# Altium integrated library WE_WR-TBL_Spring Clamp System_5.00 mm_rev15b.IntLib: 98 symbols (continued)
## 691401710024B (continued)
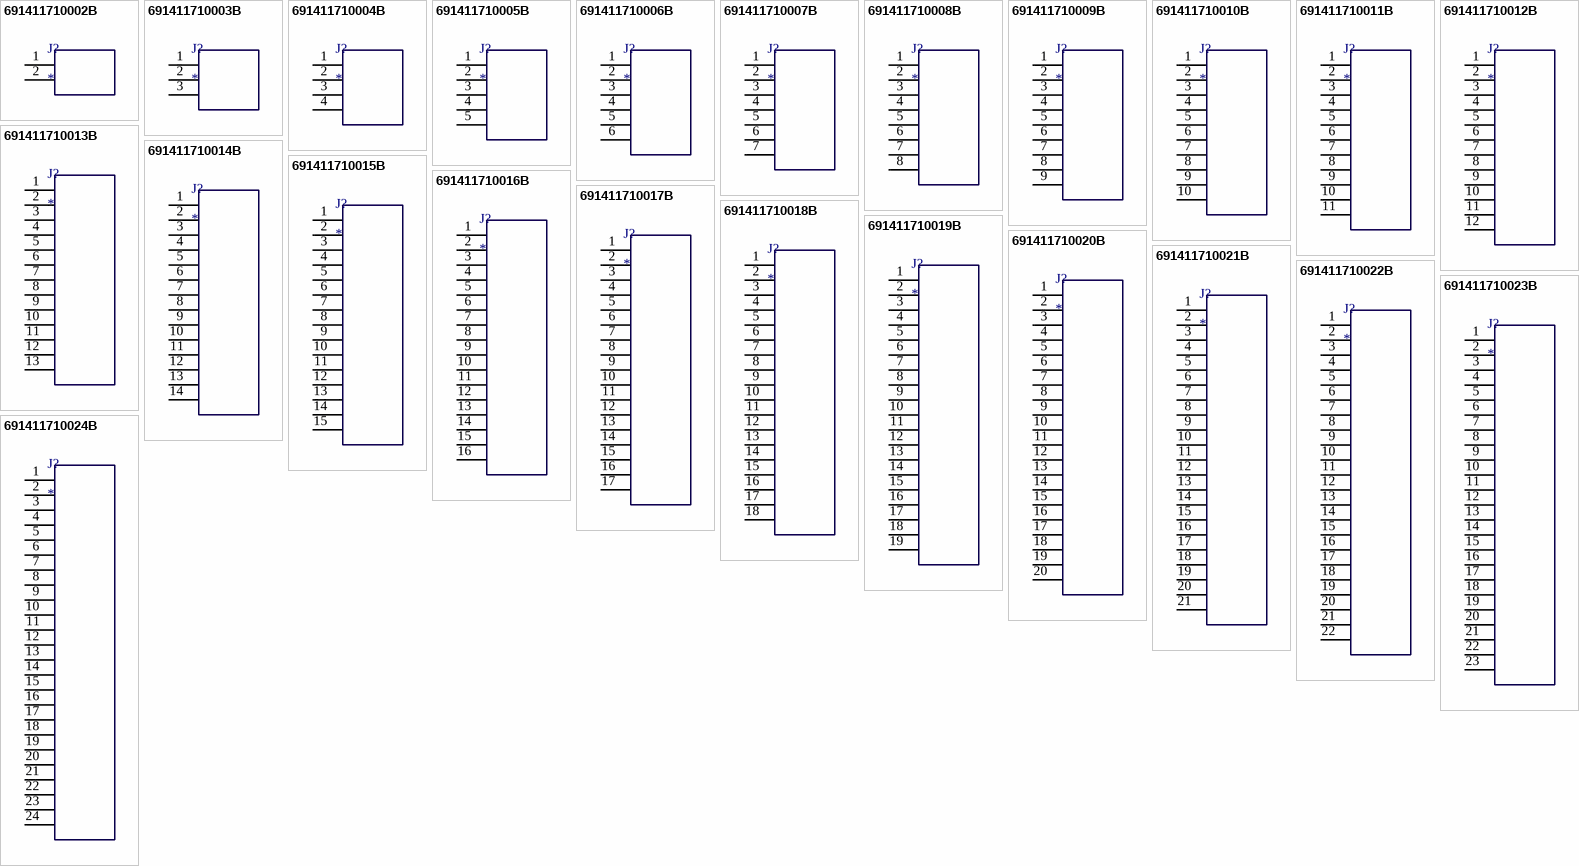
[diagram p2: symbols 691411710002B to 691411710024B]

## 691411710002B
designator J?
WR-TBL Screwless Entry Horizontal, Serie 411 B - 5.00 mm; Manufacturer: Würth Elektronik eiSos GmbH; partNo: 691411710002B; ComponentLink1 Description: Manufacturer; ComponentLink2 Description: Datasheet; NoPins: 4; ComponentLink1URL: http://www.we-online.de; ComponentLink2URL: http://katalog.we-online.de/em/datasheet/6914117100xx.pdf; Created by: Karrer Zheng; Created Date: 10/10/2014
footprint 691411710002B
pins: 1  , 2  

## 691411710003B
designator J?
WR-TBL Screwless Entry Horizontal, Serie 411 B - 5.00 mm; Manufacturer: Würth Elektronik eiSos GmbH; partNo: 691411710003B; ComponentLink1 Description: Manufacturer; ComponentLink2 Description: Datasheet; NoPins: 6; ComponentLink1URL: http://www.we-online.de; ComponentLink2URL: http://katalog.we-online.de/em/datasheet/6914117100xx.pdf; Created by: Karrer Zheng; Created Date: 10/10/2014
footprint 691411710003B
pins: 1  , 2  , 3  

## 691411710004B
designator J?
WR-TBL Screwless Entry Horizontal, Serie 411 B - 5.00 mm; Manufacturer: Würth Elektronik eiSos GmbH; partNo: 691411710004B; ComponentLink1 Description: Manufacturer; ComponentLink2 Description: Datasheet; NoPins: 8; ComponentLink1URL: http://www.we-online.de; ComponentLink2URL: http://katalog.we-online.de/em/datasheet/6914117100xx.pdf; Created by: Karrer Zheng; Created Date: 10/10/2014
footprint 691411710004B
pins: 1  , 2  , 3  , 4  

## 691411710005B
designator J?
WR-TBL Screwless Entry Horizontal, Serie 411 B - 5.00 mm; Manufacturer: Würth Elektronik eiSos GmbH; partNo: 691411710005B; ComponentLink1 Description: Manufacturer; ComponentLink2 Description: Datasheet; NoPins: 10; ComponentLink1URL: http://www.we-online.de; ComponentLink2URL: http://katalog.we-online.de/em/datasheet/6914117100xx.pdf; Created by: Karrer Zheng; Created Date: 10/10/2014
footprint 691411710005B
pins: 1  , 2  , 3  , 4  , 5  

## 691411710006B
designator J?
WR-TBL Screwless Entry Horizontal, Serie 411 B - 5.00 mm; Manufacturer: Würth Elektronik eiSos GmbH; partNo: 691411710006B; ComponentLink1 Description: Manufacturer; ComponentLink2 Description: Datasheet; NoPins: 12; ComponentLink1URL: http://www.we-online.de; ComponentLink2URL: http://katalog.we-online.de/em/datasheet/6914117100xx.pdf; Created by: Karrer Zheng; Created Date: 10/10/2014
footprint 691411710006B
pins: 1  , 2  , 3  , 4  , 5  , 6  

## 691411710007B
designator J?
WR-TBL Screwless Entry Horizontal, Serie 411 B - 5.00 mm; Manufacturer: Würth Elektronik eiSos GmbH; partNo: 691411710007B; ComponentLink1 Description: Manufacturer; ComponentLink2 Description: Datasheet; NoPins: 14; ComponentLink1URL: http://www.we-online.de; ComponentLink2URL: http://katalog.we-online.de/em/datasheet/6914117100xx.pdf; Created by: Karrer Zheng; Created Date: 10/10/2014
footprint 691411710007B
pins: 1  , 2  , 3  , 4  , 5  , 6  , 7  

## 691411710008B
designator J?
WR-TBL Screwless Entry Horizontal, Serie 411 B - 5.00 mm; Manufacturer: Würth Elektronik eiSos GmbH; partNo: 691411710008B; ComponentLink1 Description: Manufacturer; ComponentLink2 Description: Datasheet; NoPins: 16; ComponentLink1URL: http://www.we-online.de; ComponentLink2URL: http://katalog.we-online.de/em/datasheet/6914117100xx.pdf; Created by: Karrer Zheng; Created Date: 10/10/2014
footprint 691411710008B
pins: 1  , 2  , 3  , 4  , 5  , 6  , 7  , 8  

## 691411710009B
designator J?
WR-TBL Screwless Entry Horizontal, Serie 411 B - 5.00 mm; Manufacturer: Würth Elektronik eiSos GmbH; partNo: 691411710009B; ComponentLink1 Description: Manufacturer; ComponentLink2 Description: Datasheet; NoPins: 18; ComponentLink1URL: http://www.we-online.de; ComponentLink2URL: http://katalog.we-online.de/em/datasheet/6914117100xx.pdf; Created by: Karrer Zheng; Created Date: 10/10/2014
footprint 691411710009B
pins: 1  , 2  , 3  , 4  , 5  , 6  , 7  , 8  , 9  

## 691411710010B
designator J?
WR-TBL Screwless Entry Horizontal, Serie 411 B - 5.00 mm; Manufacturer: Würth Elektronik eiSos GmbH; partNo: 691411710010B; ComponentLink1 Description: Manufacturer; ComponentLink2 Description: Datasheet; NoPins: 20; ComponentLink1URL: http://www.we-online.de; ComponentLink2URL: http://katalog.we-online.de/em/datasheet/6914117100xx.pdf; Created by: Karrer Zheng; Created Date: 10/10/2014
footprint 691411710010B
pins: 1  , 2  , 3  , 4  , 5  , 6  , 7  , 8  , 9  , 10  

## 691411710011B
designator J?
WR-TBL Screwless Entry Horizontal, Serie 411 B - 5.00 mm; Manufacturer: Würth Elektronik eiSos GmbH; partNo: 691411710011B; ComponentLink1 Description: Manufacturer; ComponentLink2 Description: Datasheet; NoPins: 22; ComponentLink1URL: http://www.we-online.de; ComponentLink2URL: http://katalog.we-online.de/em/datasheet/6914117100xx.pdf; Created by: Karrer Zheng; Created Date: 10/10/2014
footprint 691411710011B
pins: 1  , 2  , 3  , 4  , 5  , 6  , 7  , 8  , 9  , 10  , 11  

## 691411710012B
designator J?
WR-TBL Screwless Entry Horizontal, Serie 411 B - 5.00 mm; Manufacturer: Würth Elektronik eiSos GmbH; partNo: 691411710012B; ComponentLink1 Description: Manufacturer; ComponentLink2 Description: Datasheet; NoPins: 24; ComponentLink1URL: http://www.we-online.de; ComponentLink2URL: http://katalog.we-online.de/em/datasheet/6914117100xx.pdf; Created by: Karrer Zheng; Created Date: 10/10/2014
footprint 691411710012B
pins: 1  , 2  , 3  , 4  , 5  , 6  , 7  , 8  , 9  , 10  , 11  , 12  

## 691411710013B
designator J?
WR-TBL Screwless Entry Horizontal, Serie 411 B - 5.00 mm; Manufacturer: Würth Elektronik eiSos GmbH; partNo: 691411710013B; ComponentLink1 Description: Manufacturer; ComponentLink2 Description: Datasheet; NoPins: 26; ComponentLink1URL: http://www.we-online.de; ComponentLink2URL: http://katalog.we-online.de/em/datasheet/6914117100xx.pdf; Created by: Karrer Zheng; Created Date: 10/10/2014
footprint 691411710013B
pins: 1  , 2  , 3  , 4  , 5  , 6  , 7  , 8  , 9  , 10  , 11  , 12  , 13  

## 691411710014B
designator J?
WR-TBL Screwless Entry Horizontal, Serie 411 B - 5.00 mm; Manufacturer: Würth Elektronik eiSos GmbH; partNo: 691411710014B; ComponentLink1 Description: Manufacturer; ComponentLink2 Description: Datasheet; NoPins: 28; ComponentLink1URL: http://www.we-online.de; ComponentLink2URL: http://katalog.we-online.de/em/datasheet/6914117100xx.pdf; Created by: Karrer Zheng; Created Date: 10/10/2014
footprint 691411710014B
pins: 1  , 2  , 3  , 4  , 5  , 6  , 7  , 8  , 9  , 10  , 11  , 12  , 13  , 14  

## 691411710015B
designator J?
WR-TBL Screwless Entry Horizontal, Serie 411 B - 5.00 mm; Manufacturer: Würth Elektronik eiSos GmbH; partNo: 691411710015B; ComponentLink1 Description: Manufacturer; ComponentLink2 Description: Datasheet; NoPins: 30; ComponentLink1URL: http://www.we-online.de; ComponentLink2URL: http://katalog.we-online.de/em/datasheet/6914117100xx.pdf; Created by: Karrer Zheng; Created Date: 10/10/2014
footprint 691411710015B
pins: 1  , 2  , 3  , 4  , 5  , 6  , 7  , 8  , 9  , 10  , 11  , 12  , 13  , 14  , 15  

## 691411710016B
designator J?
WR-TBL Screwless Entry Horizontal, Serie 411 B - 5.00 mm; Manufacturer: Würth Elektronik eiSos GmbH; partNo: 691411710016B; ComponentLink1 Description: Manufacturer; ComponentLink2 Description: Datasheet; NoPins: 32; ComponentLink1URL: http://www.we-online.de; ComponentLink2URL: http://katalog.we-online.de/em/datasheet/6914117100xx.pdf; Created by: Karrer Zheng; Created Date: 10/10/2014
footprint 691411710016B
pins: 1  , 2  , 3  , 4  , 5  , 6  , 7  , 8  , 9  , 10  , 11  , 12  , 13  , 14  , 15  , 16  

## 691411710017B
designator J?
WR-TBL Screwless Entry Horizontal, Serie 411 B - 5.00 mm; Manufacturer: Würth Elektronik eiSos GmbH; partNo: 691411710017B; ComponentLink1 Description: Manufacturer; ComponentLink2 Description: Datasheet; NoPins: 34; ComponentLink1URL: http://www.we-online.de; ComponentLink2URL: http://katalog.we-online.de/em/datasheet/6914117100xx.pdf; Created by: Karrer Zheng; Created Date: 10/10/2014
footprint 691411710017B
pins: 1  , 2  , 3  , 4  , 5  , 6  , 7  , 8  , 9  , 10  , 11  , 12  , 13  , 14  , 15  , 16  , 17  

## 691411710018B
designator J?
WR-TBL Screwless Entry Horizontal, Serie 411 B - 5.00 mm; Manufacturer: Würth Elektronik eiSos GmbH; partNo: 691411710018B; ComponentLink1 Description: Manufacturer; ComponentLink2 Description: Datasheet; NoPins: 36; ComponentLink1URL: http://www.we-online.de; ComponentLink2URL: http://katalog.we-online.de/em/datasheet/6914117100xx.pdf; Created by: Karrer Zheng; Created Date: 10/10/2014
footprint 691411710018B
pins: 1  , 2  , 3  , 4  , 5  , 6  , 7  , 8  , 9  , 10  , 11  , 12  , 13  , 14  , 15  , 16  , 17  , 18  

## 691411710019B
designator J?
WR-TBL Screwless Entry Horizontal, Serie 411 B - 5.00 mm; Manufacturer: Würth Elektronik eiSos GmbH; partNo: 691411710019B; ComponentLink1 Description: Manufacturer; ComponentLink2 Description: Datasheet; NoPins: 38; ComponentLink1URL: http://www.we-online.de; ComponentLink2URL: http://katalog.we-online.de/em/datasheet/6914117100xx.pdf; Created by: Karrer Zheng; Created Date: 10/10/2014
footprint 691411710019B
pins: 1  , 2  , 3  , 4  , 5  , 6  , 7  , 8  , 9  , 10  , 11  , 12  , 13  , 14  , 15  , 16  , 17  , 18  , 19  

## 691411710020B
designator J?
WR-TBL Screwless Entry Horizontal, Serie 411 B - 5.00 mm; Manufacturer: Würth Elektronik eiSos GmbH; partNo: 691411710020B; ComponentLink1 Description: Manufacturer; ComponentLink2 Description: Datasheet; NoPins: 40; ComponentLink1URL: http://www.we-online.de; ComponentLink2URL: http://katalog.we-online.de/em/datasheet/6914117100xx.pdf; Created by: Karrer Zheng; Created Date: 10/10/2014
footprint 691411710020B
pins: 1  , 2  , 3  , 4  , 5  , 6  , 7  , 8  , 9  , 10  , 11  , 12  , 13  , 14  , 15  , 16  , 17  , 18  , 19  , 20  

## 691411710021B
designator J?
WR-TBL Screwless Entry Horizontal, Serie 411 B - 5.00 mm; Manufacturer: Würth Elektronik eiSos GmbH; partNo: 691411710021B; ComponentLink1 Description: Manufacturer; ComponentLink2 Description: Datasheet; NoPins: 42; ComponentLink1URL: http://www.we-online.de; ComponentLink2URL: http://katalog.we-online.de/em/datasheet/6914117100xx.pdf; Created by: Karrer Zheng; Created Date: 10/10/2014
footprint 691411710021B
pins: 1  , 2  , 3  , 4  , 5  , 6  , 7  , 8  , 9  , 10  , 11  , 12  , 13  , 14  , 15  , 16  , 17  , 18  , 19  , 20  , 21  

## 691411710022B
designator J?
WR-TBL Screwless Entry Horizontal, Serie 411 B - 5.00 mm; Manufacturer: Würth Elektronik eiSos GmbH; partNo: 691411710022B; ComponentLink1 Description: Manufacturer; ComponentLink2 Description: Datasheet; NoPins: 44; ComponentLink1URL: http://www.we-online.de; ComponentLink2URL: http://katalog.we-online.de/em/datasheet/6914117100xx.pdf; Created by: Karrer Zheng; Created Date: 10/10/2014
footprint 691411710022B
pins: 1  , 2  , 3  , 4  , 5  , 6  , 7  , 8  , 9  , 10  , 11  , 12  , 13  , 14  , 15  , 16  , 17  , 18  , 19  , 20  , 21  , 22  

## 691411710023B
designator J?
WR-TBL Screwless Entry Horizontal, Serie 411 B - 5.00 mm; Manufacturer: Würth Elektronik eiSos GmbH; partNo: 691411710023B; ComponentLink1 Description: Manufacturer; ComponentLink2 Description: Datasheet; NoPins: 46; ComponentLink1URL: http://www.we-online.de; ComponentLink2URL: http://katalog.we-online.de/em/datasheet/6914117100xx.pdf; Created by: Karrer Zheng; Created Date: 10/10/2014
footprint 691411710023B
pins: 1  , 2  , 3  , 4  , 5  , 6  , 7  , 8  , 9  , 10  , 11  , 12  , 13  , 14  , 15  , 16  , 17  , 18  , 19  , 20  , 21  , 22  , 23  

## 691411710024B
designator J?
WR-TBL Screwless Entry Horizontal, Serie 411 B - 5.00 mm; Manufacturer: Würth Elektronik eiSos GmbH; partNo: 691411710024B; ComponentLink1 Description: Manufacturer; ComponentLink2 Description: Datasheet; NoPins: 48; ComponentLink1URL: http://www.we-online.de; ComponentLink2URL: http://katalog.we-online.de/em/datasheet/6914117100xx.pdf; Created by: Karrer Zheng; Created Date: 10/10/2014
footprint 691411710024B
pins: 1  , 2  , 3  , 4  , 5  , 6  , 7  , 8  , 9  , 10  , 11  , 12  , 13  , 14  , 15  , 16  , 17  , 18  , 19  , 20  , 21  , 22  , 23  , 24  


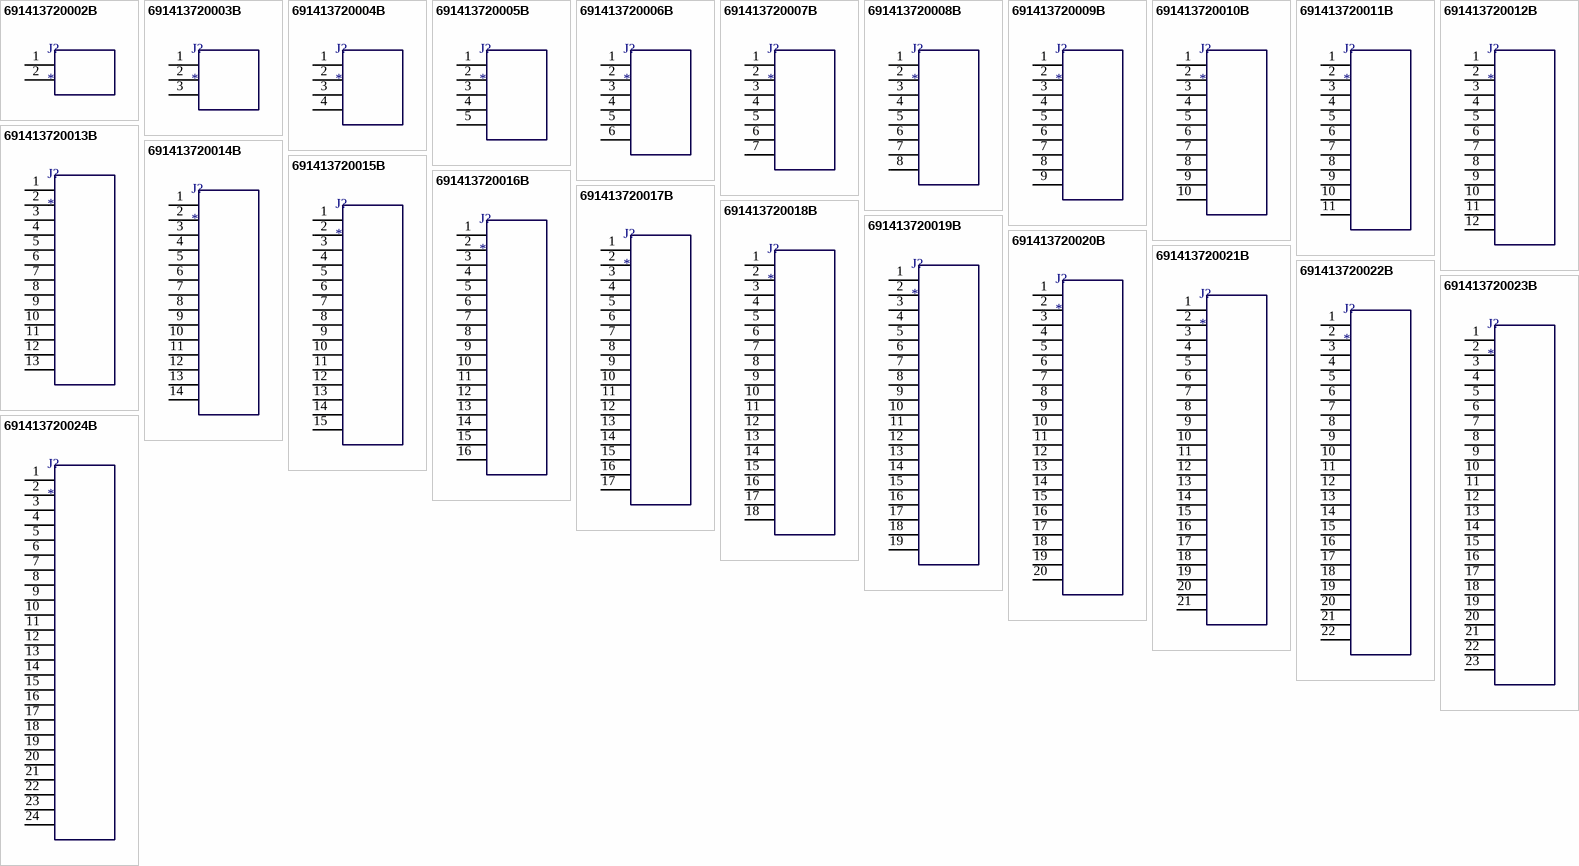
[diagram p3: symbols 691413720002B to 691413720024B]

## 691413720002B
designator J?
WR-TBL Screwless Entry 45°, Serie 413 B - 5.0 mm; Manufacturer: Würth Elektronik eiSos GmbH; partNo: 691413720002B; ComponentLink1 Description: Manufacturer; ComponentLink2 Description: Datasheet; NoPins: 4; ComponentLink1URL: http://www.we-online.de; ComponentLink2URL: http://katalog.we-online.de/em/datasheet/6914137200xxB.pdf; Created by: Karrer Zheng; Created Date: 10/1/2014
footprint 691413720002B
pins: 1  , 2  

## 691413720003B
designator J?
WR-TBL Screwless Entry 45°, Serie 413 B - 5.0 mm; Manufacturer: Würth Elektronik eiSos GmbH; partNo: 691413720003B; ComponentLink1 Description: Manufacturer; ComponentLink2 Description: Datasheet; NoPins: 6; ComponentLink1URL: http://www.we-online.de; ComponentLink2URL: http://katalog.we-online.de/em/datasheet/6914137200xxB.pdf; Created by: Karrer Zheng; Created Date: 10/1/2014
footprint 691413720003B
pins: 1  , 2  , 3  

## 691413720004B
designator J?
WR-TBL Screwless Entry 45°, Serie 413 B - 5.0 mm; Manufacturer: Würth Elektronik eiSos GmbH; partNo: 691413720004B; ComponentLink1 Description: Manufacturer; ComponentLink2 Description: Datasheet; NoPins: 8; ComponentLink1URL: http://www.we-online.de; ComponentLink2URL: http://katalog.we-online.de/em/datasheet/6914137200xxB.pdf; Created by: Karrer Zheng; Created Date: 10/1/2014
footprint 691413720004B
pins: 1  , 2  , 3  , 4  

## 691413720005B
designator J?
WR-TBL Screwless Entry 45°, Serie 413 B - 5.0 mm; Manufacturer: Würth Elektronik eiSos GmbH; partNo: 691413720005B; ComponentLink1 Description: Manufacturer; ComponentLink2 Description: Datasheet; NoPins: 10; ComponentLink1URL: http://www.we-online.de; ComponentLink2URL: http://katalog.we-online.de/em/datasheet/6914137200xxB.pdf; Created by: Karrer Zheng; Created Date: 10/1/2014
footprint 691413720005B
pins: 1  , 2  , 3  , 4  , 5  

## 691413720006B
designator J?
WR-TBL Screwless Entry 45°, Serie 413 B - 5.0 mm; Manufacturer: Würth Elektronik eiSos GmbH; partNo: 691413720006B; ComponentLink1 Description: Manufacturer; ComponentLink2 Description: Datasheet; NoPins: 12; ComponentLink1URL: http://www.we-online.de; ComponentLink2URL: http://katalog.we-online.de/em/datasheet/6914137200xxB.pdf; Created by: Karrer Zheng; Created Date: 10/1/2014
footprint 691413720006B
pins: 1  , 2  , 3  , 4  , 5  , 6  

## 691413720007B
designator J?
WR-TBL Screwless Entry 45°, Serie 413 B - 5.0 mm; Manufacturer: Würth Elektronik eiSos GmbH; partNo: 691413720007B; ComponentLink1 Description: Manufacturer; ComponentLink2 Description: Datasheet; NoPins: 14; ComponentLink1URL: http://www.we-online.de; ComponentLink2URL: http://katalog.we-online.de/em/datasheet/6914137200xxB.pdf; Created by: Karrer Zheng; Created Date: 10/1/2014
footprint 691413720007B
pins: 1  , 2  , 3  , 4  , 5  , 6  , 7  

## 691413720008B
designator J?
WR-TBL Screwless Entry 45°, Serie 413 B - 5.0 mm; Manufacturer: Würth Elektronik eiSos GmbH; partNo: 691413720008B; ComponentLink1 Description: Manufacturer; ComponentLink2 Description: Datasheet; NoPins: 16; ComponentLink1URL: http://www.we-online.de; ComponentLink2URL: http://katalog.we-online.de/em/datasheet/6914137200xxB.pdf; Created by: Karrer Zheng; Created Date: 10/1/2014
footprint 691413720008B
pins: 1  , 2  , 3  , 4  , 5  , 6  , 7  , 8  

## 691413720009B
designator J?
WR-TBL Screwless Entry 45°, Serie 413 B - 5.0 mm; Manufacturer: Würth Elektronik eiSos GmbH; partNo: 691413720009B; ComponentLink1 Description: Manufacturer; ComponentLink2 Description: Datasheet; NoPins: 18; ComponentLink1URL: http://www.we-online.de; ComponentLink2URL: http://katalog.we-online.de/em/datasheet/6914137200xxB.pdf; Created by: Karrer Zheng; Created Date: 10/1/2014
footprint 691413720009B
pins: 1  , 2  , 3  , 4  , 5  , 6  , 7  , 8  , 9  

## 691413720010B
designator J?
WR-TBL Screwless Entry 45°, Serie 413 B - 5.0 mm; Manufacturer: Würth Elektronik eiSos GmbH; partNo: 691413720010B; ComponentLink1 Description: Manufacturer; ComponentLink2 Description: Datasheet; NoPins: 20; ComponentLink1URL: http://www.we-online.de; ComponentLink2URL: http://katalog.we-online.de/em/datasheet/6914137200xxB.pdf; Created by: Karrer Zheng; Created Date: 10/1/2014
footprint 691413720010B (5.0mm - Spring clamp/Screw less - 45° entry - 11p)
pins: 1  , 2  , 3  , 4  , 5  , 6  , 7  , 8  , 9  , 10  

## 691413720011B
designator J?
WR-TBL Screwless Entry 45°, Serie 413 B - 5.0 mm; Manufacturer: Würth Elektronik eiSos GmbH; partNo: 691413720011B; ComponentLink1 Description: Manufacturer; ComponentLink2 Description: Datasheet; NoPins: 22; ComponentLink1URL: http://www.we-online.de; ComponentLink2URL: http://katalog.we-online.de/em/datasheet/6914137200xxB.pdf; Created by: Karrer Zheng; Created Date: 10/1/2014
footprint 691413720011B
pins: 1  , 2  , 3  , 4  , 5  , 6  , 7  , 8  , 9  , 10  , 11  

## 691413720012B
designator J?
WR-TBL Screwless Entry 45°, Serie 413 B - 5.0 mm; Manufacturer: Würth Elektronik eiSos GmbH; partNo: 691413720012B; ComponentLink1 Description: Manufacturer; ComponentLink2 Description: Datasheet; NoPins: 24; ComponentLink1URL: http://www.we-online.de; ComponentLink2URL: http://katalog.we-online.de/em/datasheet/6914137200xxB.pdf; Created by: Karrer Zheng; Created Date: 10/1/2014
footprint 691413720012B
pins: 1  , 2  , 3  , 4  , 5  , 6  , 7  , 8  , 9  , 10  , 11  , 12  

## 691413720013B
designator J?
WR-TBL Screwless Entry 45°, Serie 413 B - 5.0 mm; Manufacturer: Würth Elektronik eiSos GmbH; partNo: 691413720013B; ComponentLink1 Description: Manufacturer; ComponentLink2 Description: Datasheet; NoPins: 26; ComponentLink1URL: http://www.we-online.de; ComponentLink2URL: http://katalog.we-online.de/em/datasheet/6914137200xxB.pdf; Created by: Karrer Zheng; Created Date: 10/1/2014
footprint 691413720013B
pins: 1  , 2  , 3  , 4  , 5  , 6  , 7  , 8  , 9  , 10  , 11  , 12  , 13  

## 691413720014B
designator J?
WR-TBL Screwless Entry 45°, Serie 413 B - 5.0 mm; Manufacturer: Würth Elektronik eiSos GmbH; partNo: 691413720014B; ComponentLink1 Description: Manufacturer; ComponentLink2 Description: Datasheet; NoPins: 28; ComponentLink1URL: http://www.we-online.de; ComponentLink2URL: http://katalog.we-online.de/em/datasheet/6914137200xxB.pdf; Created by: Karrer Zheng; Created Date: 10/1/2014
footprint 691413720014B
pins: 1  , 2  , 3  , 4  , 5  , 6  , 7  , 8  , 9  , 10  , 11  , 12  , 13  , 14  

## 691413720015B
designator J?
WR-TBL Screwless Entry 45°, Serie 413 B - 5.0 mm; Manufacturer: Würth Elektronik eiSos GmbH; partNo: 691413720015B; ComponentLink1 Description: Manufacturer; ComponentLink2 Description: Datasheet; NoPins: 30; ComponentLink1URL: http://www.we-online.de; ComponentLink2URL: http://katalog.we-online.de/em/datasheet/6914137200xxB.pdf; Created by: Karrer Zheng; Created Date: 10/1/2014
footprint 691413720015B
pins: 1  , 2  , 3  , 4  , 5  , 6  , 7  , 8  , 9  , 10  , 11  , 12  , 13  , 14  , 15  

## 691413720016B
designator J?
WR-TBL Screwless Entry 45°, Serie 413 B - 5.0 mm; Manufacturer: Würth Elektronik eiSos GmbH; partNo: 691413720016B; ComponentLink1 Description: Manufacturer; ComponentLink2 Description: Datasheet; NoPins: 32; ComponentLink1URL: http://www.we-online.de; ComponentLink2URL: http://katalog.we-online.de/em/datasheet/6914137200xxB.pdf; Created by: Karrer Zheng; Created Date: 10/1/2014
footprint 691413720016B
pins: 1  , 2  , 3  , 4  , 5  , 6  , 7  , 8  , 9  , 10  , 11  , 12  , 13  , 14  , 15  , 16  

## 691413720017B
designator J?
WR-TBL Screwless Entry 45°, Serie 413 B - 5.0 mm; Manufacturer: Würth Elektronik eiSos GmbH; partNo: 691413720017B; ComponentLink1 Description: Manufacturer; ComponentLink2 Description: Datasheet; NoPins: 34; ComponentLink1URL: http://www.we-online.de; ComponentLink2URL: http://katalog.we-online.de/em/datasheet/6914137200xxB.pdf; Created by: Karrer Zheng; Created Date: 10/1/2014
footprint 691413720017B
pins: 1  , 2  , 3  , 4  , 5  , 6  , 7  , 8  , 9  , 10  , 11  , 12  , 13  , 14  , 15  , 16  , 17  

## 691413720018B
designator J?
WR-TBL Screwless Entry 45°, Serie 413 B - 5.0 mm; Manufacturer: Würth Elektronik eiSos GmbH; partNo: 691413720018B; ComponentLink1 Description: Manufacturer; ComponentLink2 Description: Datasheet; NoPins: 36; ComponentLink1URL: http://www.we-online.de; ComponentLink2URL: http://katalog.we-online.de/em/datasheet/6914137200xxB.pdf; Created by: Karrer Zheng; Created Date: 10/1/2014
footprint 691413720018B
pins: 1  , 2  , 3  , 4  , 5  , 6  , 7  , 8  , 9  , 10  , 11  , 12  , 13  , 14  , 15  , 16  , 17  , 18  

## 691413720019B
designator J?
WR-TBL Screwless Entry 45°, Serie 413 B - 5.0 mm; Manufacturer: Würth Elektronik eiSos GmbH; partNo: 691413720019B; ComponentLink1 Description: Manufacturer; ComponentLink2 Description: Datasheet; NoPins: 38; ComponentLink1URL: http://www.we-online.de; ComponentLink2URL: http://katalog.we-online.de/em/datasheet/6914137200xxB.pdf; Created by: Karrer Zheng; Created Date: 10/1/2014
footprint 691413720019B
pins: 1  , 2  , 3  , 4  , 5  , 6  , 7  , 8  , 9  , 10  , 11  , 12  , 13  , 14  , 15  , 16  , 17  , 18  , 19  

## 691413720020B
designator J?
WR-TBL Screwless Entry 45°, Serie 413 B - 5.0 mm; Manufacturer: Würth Elektronik eiSos GmbH; partNo: 691413720020B; ComponentLink1 Description: Manufacturer; ComponentLink2 Description: Datasheet; NoPins: 40; ComponentLink1URL: http://www.we-online.de; ComponentLink2URL: http://katalog.we-online.de/em/datasheet/6914137200xxB.pdf; Created by: Karrer Zheng; Created Date: 10/1/2014
footprint 691413720020B
pins: 1  , 2  , 3  , 4  , 5  , 6  , 7  , 8  , 9  , 10  , 11  , 12  , 13  , 14  , 15  , 16  , 17  , 18  , 19  , 20  

## 691413720021B
designator J?
WR-TBL Screwless Entry 45°, Serie 413 B - 5.0 mm; Manufacturer: Würth Elektronik eiSos GmbH; partNo: 691413720021B; ComponentLink1 Description: Manufacturer; ComponentLink2 Description: Datasheet; NoPins: 42; ComponentLink1URL: http://www.we-online.de; ComponentLink2URL: http://katalog.we-online.de/em/datasheet/6914137200xxB.pdf; Created by: Karrer Zheng; Created Date: 10/1/2014
footprint 691413720021B
pins: 1  , 2  , 3  , 4  , 5  , 6  , 7  , 8  , 9  , 10  , 11  , 12  , 13  , 14  , 15  , 16  , 17  , 18  , 19  , 20  , 21  

## 691413720022B
designator J?
WR-TBL Screwless Entry 45°, Serie 413 B - 5.0 mm; Manufacturer: Würth Elektronik eiSos GmbH; partNo: 691413720022B; ComponentLink1 Description: Manufacturer; ComponentLink2 Description: Datasheet; NoPins: 44; ComponentLink1URL: http://www.we-online.de; ComponentLink2URL: http://katalog.we-online.de/em/datasheet/6914137200xxB.pdf; Created by: Karrer Zheng; Created Date: 10/1/2014
footprint 691413720022B
pins: 1  , 2  , 3  , 4  , 5  , 6  , 7  , 8  , 9  , 10  , 11  , 12  , 13  , 14  , 15  , 16  , 17  , 18  , 19  , 20  , 21  , 22  

## 691413720023B
designator J?
WR-TBL Screwless Entry 45°, Serie 413 B - 5.0 mm; Manufacturer: Würth Elektronik eiSos GmbH; partNo: 691413720023B; ComponentLink1 Description: Manufacturer; ComponentLink2 Description: Datasheet; NoPins: 46; ComponentLink1URL: http://www.we-online.de; ComponentLink2URL: http://katalog.we-online.de/em/datasheet/6914137200xxB.pdf; Created by: Karrer Zheng; Created Date: 10/1/2014
footprint 691413720023B
pins: 1  , 2  , 3  , 4  , 5  , 6  , 7  , 8  , 9  , 10  , 11  , 12  , 13  , 14  , 15  , 16  , 17  , 18  , 19  , 20  , 21  , 22  , 23  

## 691413720024B
designator J?
WR-TBL Screwless Entry 45°, Serie 413 B - 5.0 mm; Manufacturer: Würth Elektronik eiSos GmbH; partNo: 691413720024B; ComponentLink1 Description: Manufacturer; ComponentLink2 Description: Datasheet; NoPins: 48; ComponentLink1URL: http://www.we-online.de; ComponentLink2URL: http://katalog.we-online.de/em/datasheet/6914137200xxB.pdf; Created by: Karrer Zheng; Created Date: 10/1/2014
footprint 691413720024B
pins: 1  , 2  , 3  , 4  , 5  , 6  , 7  , 8  , 9  , 10  , 11  , 12  , 13  , 14  , 15  , 16  , 17  , 18  , 19  , 20  , 21  , 22  , 23  , 24  


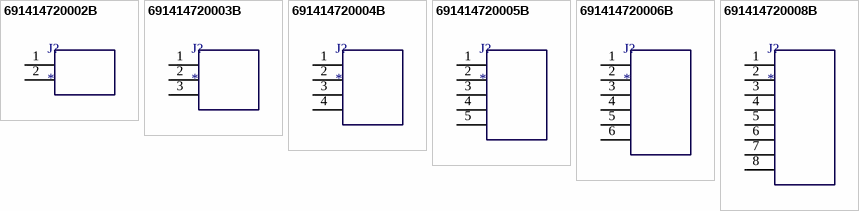
[diagram p4: symbols 691414720002B to 691414720008B]

## 691414720002B
designator J?
WR-TBL Screwless Entry 45°, Serie 4147 B - 5.00 mm; Manufacturer: Würth Elektronik eiSos GmbH; partNo: 691414720002B; ComponentLink1 Description: Manufacturer; ComponentLink2 Description: Datasheet; NoPins: 4; ComponentLink1URL: http://www.we-online.de; ComponentLink2URL: http://katalog.we-online.de/em/datasheet/6914147200xx.pdf; Created by: Karrer Zheng; Created Date: 10/10/2014
footprint 691414720002B
pins: 1  , 2  

## 691414720003B
designator J?
WR-TBL Screwless Entry 45°, Serie 4147 B - 5.00 mm; Manufacturer: Würth Elektronik eiSos GmbH; partNo: 691414720003B; ComponentLink1 Description: Manufacturer; ComponentLink2 Description: Datasheet; NoPins: 6; ComponentLink1URL: http://www.we-online.de; ComponentLink2URL: http://katalog.we-online.de/em/datasheet/6914147200xx.pdf; Created by: Karrer Zheng; Created Date: 10/10/2014
footprint 691414720003B
pins: 1  , 2  , 3  

## 691414720004B
designator J?
WR-TBL Screwless Entry 45°, Serie 4147 B - 5.00 mm; Manufacturer: Würth Elektronik eiSos GmbH; partNo: 691414720004B; ComponentLink1 Description: Manufacturer; ComponentLink2 Description: Datasheet; NoPins: 8; ComponentLink1URL: http://www.we-online.de; ComponentLink2URL: http://katalog.we-online.de/em/datasheet/6914147200xx.pdf; Created by: Karrer Zheng; Created Date: 10/10/2014
footprint 691414720004B
pins: 1  , 2  , 3  , 4  

## 691414720005B
designator J?
WR-TBL Screwless Entry 45°, Serie 4147 B - 5.00 mm; Manufacturer: Würth Elektronik eiSos GmbH; partNo: 691414720005B; ComponentLink1 Description: Manufacturer; ComponentLink2 Description: Datasheet; NoPins: 10; ComponentLink1URL: http://www.we-online.de; ComponentLink2URL: http://katalog.we-online.de/em/datasheet/6914147200xx.pdf; Created by: Karrer Zheng; Created Date: 10/10/2014
footprint 691414720005B
pins: 1  , 2  , 3  , 4  , 5  

## 691414720006B
designator J?
WR-TBL Screwless Entry 45°, Serie 4147 B - 5.00 mm; Manufacturer: Würth Elektronik eiSos GmbH; partNo: 691414720006B; ComponentLink1 Description: Manufacturer; ComponentLink2 Description: Datasheet; NoPins: 12; ComponentLink1URL: http://www.we-online.de; ComponentLink2URL: http://katalog.we-online.de/em/datasheet/6914147200xx.pdf; Created by: Karrer Zheng; Created Date: 10/10/2014
footprint 691414720006B
pins: 1  , 2  , 3  , 4  , 5  , 6  

## 691414720008B
designator J?
WR-TBL Screwless Entry 45°, Serie 4147 B - 5.00 mm; Manufacturer: Würth Elektronik eiSos GmbH; partNo: 691414720008B; ComponentLink1 Description: Manufacturer; ComponentLink2 Description: Datasheet; NoPins: 16; ComponentLink1URL: http://www.we-online.de; ComponentLink2URL: http://katalog.we-online.de/em/datasheet/6914147200xx.pdf; Created by: Karrer Zheng; Created Date: 10/10/2014
footprint 691414720008B
pins: 1  , 2  , 3  , 4  , 5  , 6  , 7  , 8  